# Altium footprint library PCB_GENERAL.PcbLib: 226 footprints (part 7 of 15)
Each footprint in its own frame and in the unit in brackets; x right, y up, seen from the top. Pads: shape width x height; smd on the part's side, far side on the other; paste and mask are expansions set on the pad; w line width, h text height; cw(c..) or ccw(c..) is an arc to the next point about the centre after c.
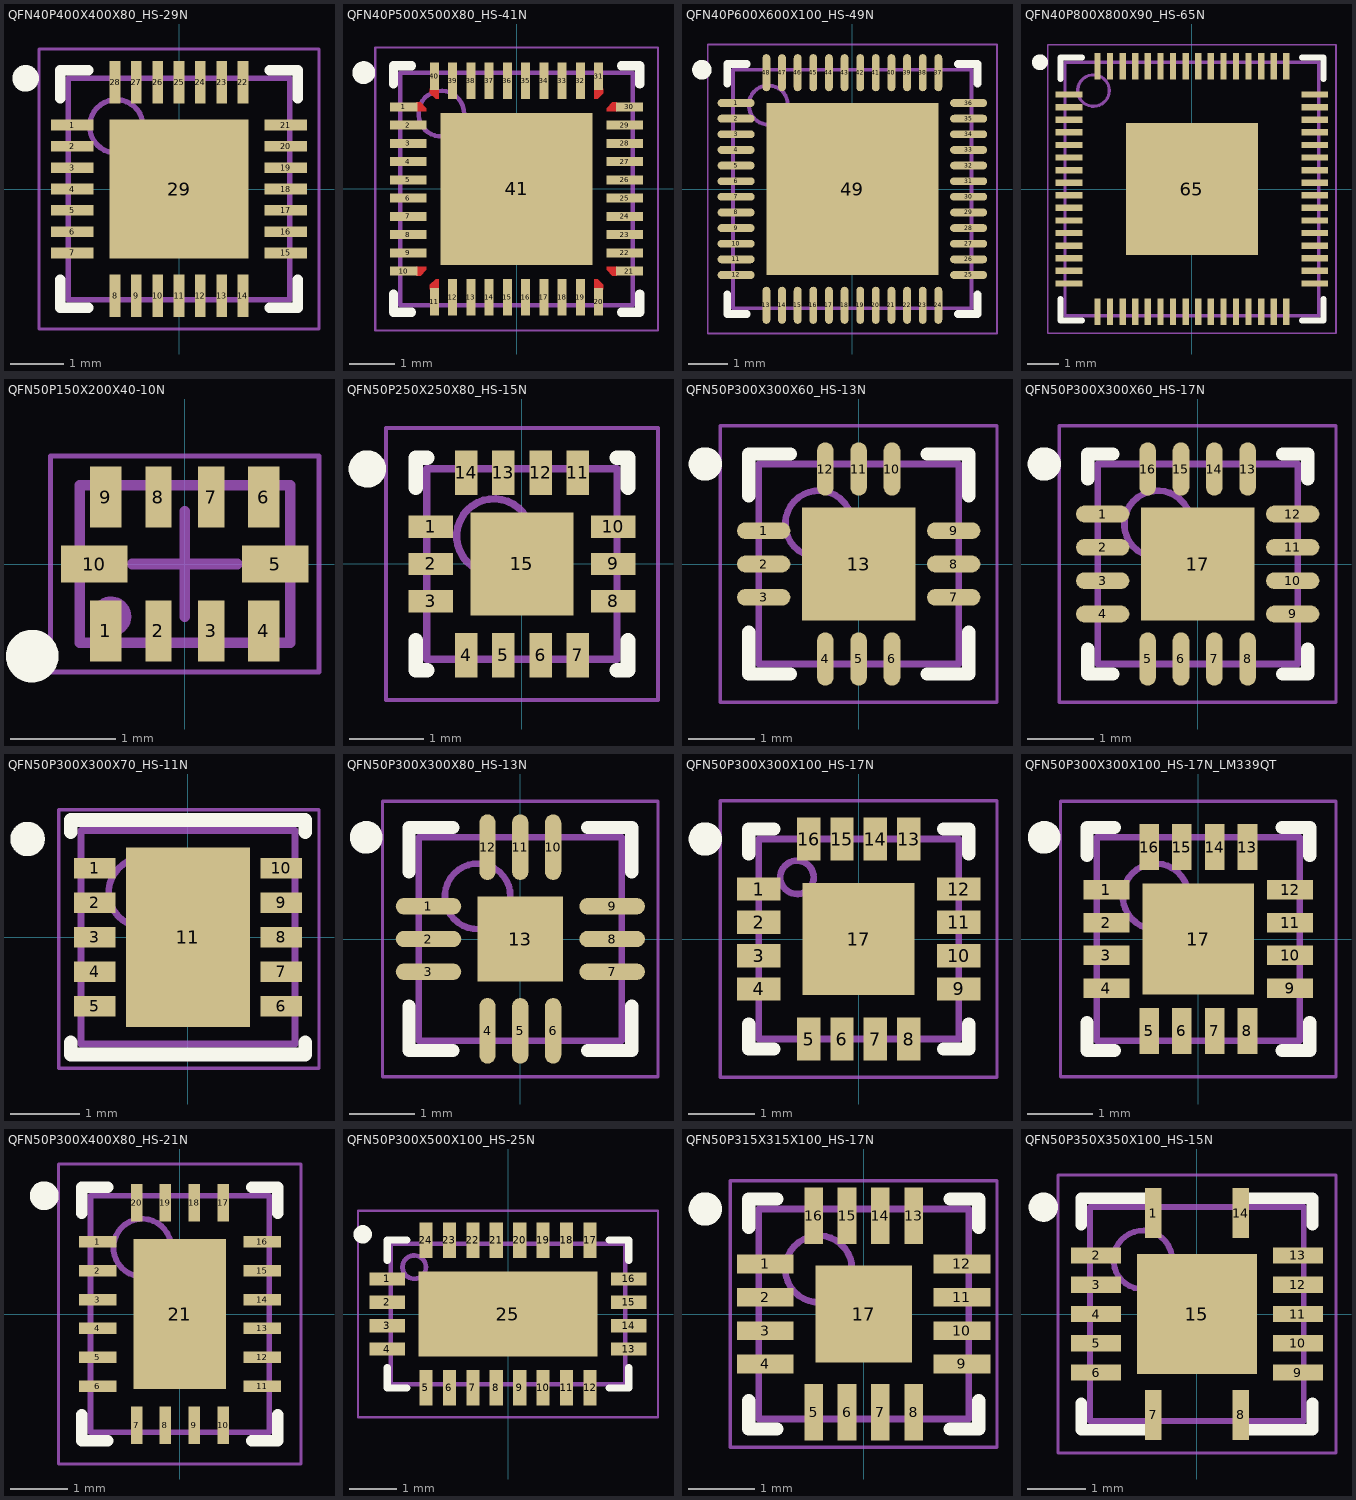
[diagram p6: the footprints below, top view; thin cyan lines are the x and y axes]

## QFN40P400X400X80_HS-29N [mm] "QFN, 28-Leads, Body 4,00x4,00mm, Pitch 0,40mm, Thermal Pad 2,60x2,60mm, IPC Medium Density"
height 0.8
pads (29):
  rect 0.8x0.2 smd: 1(-2,1.2) 2(-2,0.8) 3(-2,0.4) 4(-2,0) 5(-2,-0.4) 6(-2,-0.8) 7(-2,-1.2) 15(2,-1.2) 16(2,-0.8) 17(2,-0.4) 18(2,0) 19(2,0.4) 20(2,0.8) 21(2,1.2)
  rect 0.2x0.8 smd: 8(-1.2,-2) 9(-0.8,-2) 10(-0.4,-2) 11(0,-2) 12(0.4,-2) 13(0.8,-2) 14(1.2,-2) 22(1.2,2) 23(0.8,2) 24(0.4,2) 25(0,2) 26(-0.4,2) 27(-0.8,2) 28(-1.2,2)
  rect 2.6x2.6 smd: 29(0,0)
Top Overlay:
  circle w0.25: c-2.875,2.075 r0.125
  lines w0.2: -2.225,-1.7 -2.225,-2.225 -1.7,-2.225 ; -2.225,1.7 -2.225,2.225 -1.7,2.225 ; 1.7,-2.225 2.225,-2.225 2.225,-1.7 ; 1.7,2.225 2.225,2.225 2.225,1.7
Mechanical 11:
  text ".Designator" at -0.97,-0.25 h0.76
Mechanical 14:
  circle w0.1: c-1.175,1.175 r0.5
  lines w0.1: -2.075,-2.075 2.075,-2.075 2.075,2.075 -2.075,2.075 -2.075,-2.075
Mechanical 15:
  lines w0.05: -2.625,-2.625 2.625,-2.625 2.625,2.625 -2.625,2.625 -2.625,-2.625
  lines w0.1: -0.5,0 0.5,0 ; 0,-0.5 0,0.5
3D body "QFN40P400X400X80_HS-29N.step": height 0.8, standoff 0, extent -2.076,-2.076 2.076,2.076

## QFN40P500X500X80_HS-41N [mm] "QFN, 40-Leads, Body 5,00x5,00mm, Pitch 0,40mm, Thermal Pad 3,33x3,33mm, IPC Medium Density"
height 0.8
pads (41):
  rect 0.6x0.2 smd: 1(-2.475,1.8) 10(-2.475,-1.8) 21(2.475,-1.8) 30(2.475,1.8)
  rect 0.8x0.2 smd: 2(-2.375,1.4) 3(-2.375,1) 4(-2.375,0.6) 5(-2.375,0.2) 6(-2.375,-0.2) 7(-2.375,-0.6) 8(-2.375,-1) 9(-2.375,-1.4) 22(2.375,-1.4) 23(2.375,-1) 24(2.375,-0.6) 25(2.375,-0.2) 26(2.375,0.2) 27(2.375,0.6) 28(2.375,1) 29(2.375,1.4)
  rect 0.2x0.6 smd: 11(-1.8,-2.475) 20(1.8,-2.475) 31(1.8,2.475) 40(-1.8,2.475)
  rect 0.2x0.8 smd: 12(-1.4,-2.375) 13(-1,-2.375) 14(-0.6,-2.375) 15(-0.2,-2.375) 16(0.2,-2.375) 17(0.6,-2.375) 18(1,-2.375) 19(1.4,-2.375) 32(1.4,2.375) 33(1,2.375) 34(0.6,2.375) 35(0.2,2.375) 36(-0.2,2.375) 37(-0.6,2.375) 38(-1,2.375) 39(-1.4,2.375)
  rect 3.33x3.33 smd: 41(0,0)
Top Layer:
  region: 1.7,2.2 1.7,1.975 1.775,1.975 1.9,2.1 1.9,2.2
  region: 2.2,1.7 1.975,1.7 1.975,1.775 2.1,1.9 2.2,1.9
  region: 2.2,-1.7 1.975,-1.7 1.975,-1.775 2.1,-1.9 2.2,-1.9
  region: 1.7,-2.2 1.7,-1.975 1.775,-1.975 1.9,-2.1 1.9,-2.2
  region: -1.7,-2.2 -1.7,-1.975 -1.775,-1.975 -1.9,-2.1 -1.9,-2.2
  region: -2.2,-1.7 -1.975,-1.7 -1.975,-1.775 -2.1,-1.9 -2.2,-1.9
  region: -1.7,2.2 -1.7,1.975 -1.775,1.975 -1.9,2.1 -1.9,2.2
  region: -2.2,1.7 -1.975,1.7 -1.975,1.775 -2.1,1.9 -2.2,1.9
Top Overlay:
  circle w0.25: c-3.35,2.55 r0.125
  lines w0.2: -2.7,-2.3 -2.7,-2.7 -2.3,-2.7 ; -2.7,2.3 -2.7,2.7 -2.3,2.7 ; 2.3,-2.7 2.7,-2.7 2.7,-2.3 ; 2.3,2.7 2.7,2.7 2.7,2.3
Top Paste:
  region: 1.7,2.2 1.7,1.975 1.775,1.975 1.9,2.1 1.9,2.2
  region: 2.2,1.7 1.975,1.7 1.975,1.775 2.1,1.9 2.2,1.9
  region: 2.2,-1.7 1.975,-1.7 1.975,-1.775 2.1,-1.9 2.2,-1.9
  region: 1.7,-2.2 1.7,-1.975 1.775,-1.975 1.9,-2.1 1.9,-2.2
  region: -1.7,-2.2 -1.7,-1.975 -1.775,-1.975 -1.9,-2.1 -1.9,-2.2
  region: -2.2,-1.7 -1.975,-1.7 -1.975,-1.775 -2.1,-1.9 -2.2,-1.9
  region: -1.7,2.2 -1.7,1.975 -1.775,1.975 -1.9,2.1 -1.9,2.2
  region: -2.2,1.7 -1.975,1.7 -1.975,1.775 -2.1,1.9 -2.2,1.9
Top Solder:
  region: 1.575,1.875 1.825,1.875 2,2.05 2,2.1 1.575,2.1
  region: 1.875,1.575 1.875,1.825 2.05,2 2.1,2 2.1,1.575
  region: 1.875,-1.575 1.875,-1.825 2.05,-2 2.1,-2 2.1,-1.575
  region: 1.575,-1.875 1.825,-1.875 2,-2.05 2,-2.1 1.575,-2.1
  region: -1.575,-1.875 -1.825,-1.875 -2,-2.05 -2,-2.1 -1.575,-2.1
  region: -1.875,-1.575 -1.875,-1.825 -2.05,-2 -2.1,-2 -2.1,-1.575
  region: -1.575,1.875 -1.825,1.875 -2,2.05 -2,2.1 -1.575,2.1
  region: -1.875,1.575 -1.875,1.825 -2.05,2 -2.1,2 -2.1,1.575
Mechanical 11:
  text ".Designator" at -0.925,-0.025 h1
Mechanical 14:
  circle w0.1: c-1.65,1.65 r0.5
  lines w0.1: -2.55,-2.55 2.55,-2.55 2.55,2.55 -2.55,2.55 -2.55,-2.55
Mechanical 15:
  lines w0.05: -3.1,-3.1 3.1,-3.1 3.1,3.1 -3.1,3.1 -3.1,-3.1
  lines w0.1: -0.5,0 0.5,0 ; 0,-0.5 0,0.5
3D body "QFN40P500X500X80_HS-41N.step": height 0.8, standoff 0, extent -2.551,-2.551 2.551,2.551

## QFN40P600X600X100_HS-49N [mm] "QFN, 48-Leads, Body 6,00x6,00mm, Pitch 0,40mm, Thermal Pad 4,40x4,40mm, IPC Medium Density"
height 1
pads (49):
  oval 0.95x0.2 smd: 1(-2.975,2.2) 2(-2.975,1.8) 3(-2.975,1.4) 4(-2.975,1) 5(-2.975,0.6) 6(-2.975,0.2) 7(-2.975,-0.2) 8(-2.975,-0.6) 9(-2.975,-1) 10(-2.975,-1.4) 11(-2.975,-1.8) 12(-2.975,-2.2) 25(2.975,-2.2) 26(2.975,-1.8) 27(2.975,-1.4) 28(2.975,-1) 29(2.975,-0.6) 30(2.975,-0.2) 31(2.975,0.2) 32(2.975,0.6) 33(2.975,1) 34(2.975,1.4) 35(2.975,1.8) 36(2.975,2.2)
  oval 0.2x0.95 smd: 13(-2.2,-2.975) 14(-1.8,-2.975) 15(-1.4,-2.975) 16(-1,-2.975) 17(-0.6,-2.975) 18(-0.2,-2.975) 19(0.2,-2.975) 20(0.6,-2.975) 21(1,-2.975) 22(1.4,-2.975) 23(1.8,-2.975) 24(2.2,-2.975) 37(2.2,2.975) 38(1.8,2.975) 39(1.4,2.975) 40(1,2.975) 41(0.6,2.975) 42(0.2,2.975) 43(-0.2,2.975) 44(-0.6,2.975) 45(-1,2.975) 46(-1.4,2.975) 47(-1.8,2.975) 48(-2.2,2.975)
  rect 4.4x4.4 smd: 49(0,0)
Top Overlay:
  circle w0.25: c-3.85,3.05 r0.125
  lines w0.2: -3.2,-2.7 -3.2,-3.2 -2.7,-3.2 ; -3.2,2.7 -3.2,3.2 -2.7,3.2 ; 2.7,-3.2 3.2,-3.2 3.2,-2.7 ; 2.7,3.2 3.2,3.2 3.2,2.7
Mechanical 11:
  text ".Designator" at -2.8,-0.4 h1
Mechanical 14:
  circle w0.1: c-2.15,2.15 r0.5
  lines w0.1: -3.05,-3.05 3.05,-3.05 3.05,3.05 -3.05,3.05 -3.05,-3.05
Mechanical 15:
  lines w0.05: -3.7,-3.7 3.7,-3.7 3.7,3.7 -3.7,3.7 -3.7,-3.7
  lines w0.1: -0.5,0 0.5,0 ; 0,-0.5 0,0.5
3D body "QFN40P600X600X100_HS-49N.step": height 1, standoff 0, extent -3.051,-3.051 3.051,3.051

## QFN40P800X800X90_HS-65N [mm] "QFN, 64-Leads, Body 8.00x8.00mm, Pitch 0.40mm, Thermal Pad 4.20x4.20mm, IPC Medium Density"
height 0.9
pads (65):
  rect 0.85x0.2 smd: 1(-3.9,3) 2(-3.9,2.6) 3(-3.9,2.2) 4(-3.9,1.8) 5(-3.9,1.4) 6(-3.9,1) 7(-3.9,0.6) 8(-3.9,0.2) 9(-3.9,-0.2) 10(-3.9,-0.6) 11(-3.9,-1) 12(-3.9,-1.4) 13(-3.9,-1.8) 14(-3.9,-2.2) 15(-3.9,-2.6) 16(-3.9,-3) 33(3.9,-3) 34(3.9,-2.6) 35(3.9,-2.2) 36(3.9,-1.8) 37(3.9,-1.4) 38(3.9,-1) 39(3.9,-0.6) 40(3.9,-0.2) 41(3.9,0.2) 42(3.9,0.6) 43(3.9,1) 44(3.9,1.4) 45(3.9,1.8) 46(3.9,2.2) 47(3.9,2.6) 48(3.9,3)
  rect 0.2x0.85 smd: 17(-3,-3.9) 18(-2.6,-3.9) 19(-2.2,-3.9) 20(-1.8,-3.9) 21(-1.4,-3.9) 22(-1,-3.9) 23(-0.6,-3.9) 24(-0.2,-3.9) 25(0.2,-3.9) 26(0.6,-3.9) 27(1,-3.9) 28(1.4,-3.9) 29(1.8,-3.9) 30(2.2,-3.9) 31(2.6,-3.9) 32(3,-3.9) 49(3,3.9) 50(2.6,3.9) 51(2.2,3.9) 52(1.8,3.9) 53(1.4,3.9) 54(1,3.9) 55(0.6,3.9) 56(0.2,3.9) 57(-0.2,3.9) 58(-0.6,3.9) 59(-1,3.9) 60(-1.4,3.9) 61(-1.8,3.9) 62(-2.2,3.9) 63(-2.6,3.9) 64(-3,3.9)
  rect 4.2x4.2 smd: 65(0,0)
Top Overlay:
  circle w0.25: c-4.825,4.025 r0.125
  lines w0.2: -4.175,-3.5 -4.175,-4.175 -3.5,-4.175 ; -4.175,3.5 -4.175,4.175 -3.5,4.175 ; 3.5,-4.175 4.175,-4.175 4.175,-3.5 ; 3.5,4.175 4.175,4.175 4.175,3.5
Mechanical 11:
  text ".Designator" at -3,-0.2 h1
Mechanical 14:
  circle w0.1: c-3.125,3.125 r0.5
  lines w0.1: -4.025,-4.025 4.025,-4.025 4.025,4.025 -4.025,4.025 -4.025,-4.025
Mechanical 15:
  lines w0.05: -4.575,-4.575 4.575,-4.575 4.575,4.575 -4.575,4.575 -4.575,-4.575
  lines w0.1: -0.5,0 0.5,0 ; 0,-0.5 0,0.5
3D body: height 0.9, standoff 0, extent -4.025,-4.025 4.025,4.025

## QFN50P150X200X40-10N [mm] "QFN, 10-Leads, Body 2x1.5mm"
height 0.4
pads (10):
  rect 0.3x0.58 smd: 1(-0.75,-0.635) 4(0.75,-0.635) 6(0.75,0.635) 9(-0.75,0.635)
  rect 0.25x0.58 smd: 2(-0.25,-0.635) 3(0.25,-0.635) 7(0.25,0.635) 8(-0.25,0.635)
  rect 0.63x0.35 smd: 5(0.86,0) 10(-0.86,0)
Top Overlay:
  circle w0.25: c-1.45,-0.875 r0.125
Mechanical 11:
  text ".Designator" at -1,0 h0.3
Mechanical 14:
  circle w0.1: c-0.7,-0.5 r0.141
  lines w0.1: -1,-0.75 1,-0.75 1,0.75 -1,0.75 -1,-0.75
Mechanical 15:
  lines w0.05: -1.275,-1.025 -1.275,1.025 1.275,1.025 1.275,-1.025 -1.275,-1.025
  lines w0.1: -0.5,0 0.5,0 ; 0,-0.5 0,0.5
3D body: height 0.4, standoff 0, extent -1,-0.75 1,0.75

## QFN50P250X250X80_HS-15N [mm] "QFN, 14-Leads, Body 2,50x2,50mm, Pitch 0,50mm, Thermal Pad 1,38x1,38mm, IPC Medium Density"
height 0.8
pads (15):
  rect 0.6x0.3 smd: 1(-1.225,0.5) 2(-1.225,0) 3(-1.225,-0.5) 8(1.225,-0.5) 9(1.225,0) 10(1.225,0.5)
  rect 0.3x0.6 smd: 4(-0.75,-1.225) 5(-0.25,-1.225) 6(0.25,-1.225) 7(0.75,-1.225) 11(0.75,1.225) 12(0.25,1.225) 13(-0.25,1.225) 14(-0.75,1.225)
  rect 1.38x1.38 smd: 15(0,0)
Top Overlay:
  circle w0.25: c-2.075,1.275 r0.125
  lines w0.2: -1.425,-1.025 -1.425,-1.425 -1.275,-1.425 ; -1.425,1.025 -1.425,1.425 -1.275,1.425 ; 1.275,-1.425 1.425,-1.425 1.425,-1.025 ; 1.275,1.425 1.425,1.425 1.425,1.025
Mechanical 11:
  text ".Designator" at -0.75,-0.3 h0.76
Mechanical 14:
  circle w0.1: c-0.375,0.375 r0.5
  lines w0.1: -1.275,-1.275 -1.275,1.275 1.275,1.275 1.275,-1.275 -1.275,-1.275
Mechanical 15:
  lines w0.05: -1.825,-1.825 -1.825,1.825 1.825,1.825 1.825,-1.825 -1.825,-1.825
  lines w0.1: -0.5,0 0.5,0 ; 0,-0.5 0,0.5
3D body "QFN50P250X250X80_HS-15N.step": height 0.8, standoff 0, extent -1.276,-1.276 1.276,1.276

## QFN50P300X300X60_HS-13N [mm] "QFN, 12-Leads, Body 3,00x3,00mm, Pitch 0,50mm, Thermal Pad 1,7x1,7mm, IPC Medium Density"
height 0.6
pads (13):
  oval 0.8x0.25 smd: 1(-1.425,0.5) 2(-1.425,0) 3(-1.425,-0.5) 7(1.425,-0.5) 8(1.425,0) 9(1.425,0.5)
  oval 0.25x0.8 smd: 4(-0.5,-1.425) 5(0,-1.425) 6(0.5,-1.425) 10(0.5,1.425) 11(0,1.425) 12(-0.5,1.425)
  rect 1.7x1.7 smd: 13(0,0)
Top Overlay:
  circle w0.25: c-2.3,1.5 r0.125
  lines w0.2: -1.65,-1.025 -1.65,-1.65 -1.025,-1.65 ; -1.65,1.025 -1.65,1.65 -1.025,1.65 ; 1.025,-1.65 1.65,-1.65 1.65,-1.025 ; 1.025,1.65 1.65,1.65 1.65,1.025
Mechanical 11:
  text ".Designator" at -1.15,-0.05 h0.3
Mechanical 14:
  circle w0.1: c-0.6,0.6 r0.5
  lines w0.1: -1.5,-1.5 1.5,-1.5 1.5,1.5 -1.5,1.5 -1.5,-1.5
Mechanical 15:
  lines w0.05: -2.075,-2.075 2.075,-2.075 2.075,2.075 -2.075,2.075 -2.075,-2.075
  lines w0.1: -0.5,0 0.5,0 ; 0,-0.5 0,0.5
3D body "User Library-QFN12_3x3x0_8.STEP": height 0.78, standoff -0.02, extent -1.51,-1.51 1.51,1.51

## QFN50P300X300X60_HS-17N [mm] "QFN, 16-Leads, Body 3,00x3,00mm, Pitch 0,50mm, Thermal Pad 1,68x1,68mm, IPC Medium Density"
height 0.6
pads (17):
  oval 0.8x0.25 smd: 1(-1.425,0.75) 2(-1.425,0.25) 3(-1.425,-0.25) 4(-1.425,-0.75) 9(1.425,-0.75) 10(1.425,-0.25) 11(1.425,0.25) 12(1.425,0.75)
  oval 0.25x0.8 smd: 5(-0.75,-1.425) 6(-0.25,-1.425) 7(0.25,-1.425) 8(0.75,-1.425) 13(0.75,1.425) 14(0.25,1.425) 15(-0.25,1.425) 16(-0.75,1.425)
  rect 1.7x1.7 smd: 17(0,0)
Top Overlay:
  circle w0.25: c-2.3,1.5 r0.125
  lines w0.2: -1.65,-1.275 -1.65,-1.65 -1.275,-1.65 ; -1.65,1.275 -1.65,1.65 -1.275,1.65 ; 1.275,-1.65 1.65,-1.65 1.65,-1.275 ; 1.275,1.65 1.65,1.65 1.65,1.275
Mechanical 11:
  text ".Designator" at -1.25,-0.25 h0.3
Mechanical 14:
  circle w0.1: c-0.6,0.6 r0.5
  lines w0.1: -1.5,-1.5 -1.5,1.5 1.5,1.5 1.5,-1.5 -1.5,-1.5
Mechanical 15:
  lines w0.05: -2.075,-2.075 -2.075,2.075 2.075,2.075 2.075,-2.075 -2.075,-2.075
  lines w0.1: -0.5,0 0.5,0 ; 0,-0.5 0,0.5
3D body: height 0.6, standoff 0.05, extent -1.5,-1.5 1.5,1.5

## QFN50P300X300X70_HS-11N [mm] "QFN, 10-Leads, Body 3,00x3,00mm, Pitch 0,50mm, Thermal Pad 1,60x2,40mm, IPC Medium Density"
height 0.7
pads (11):
  rect 0.6x0.3 smd: 1(-1.35,1) 2(-1.35,0.5) 3(-1.35,0) 4(-1.35,-0.5) 5(-1.35,-1) 6(1.35,-1) 7(1.35,-0.5) 8(1.35,0) 9(1.35,0.5) 10(1.35,1)
  rect 1.8x2.6 smd: 11(0,0)
Top Overlay:
  circle w0.25: c-2.325,1.425 r0.125
  lines w0.2: -1.7,-1.525 -1.7,-1.7 0.275,-1.7 1.7,-1.7 1.7,-1.525 ; -1.7,1.525 -1.7,1.7 0.275,1.7 1.7,1.7 1.7,1.525
Mechanical 11:
  text ".Designator" at -2.25,2.65 h1
Mechanical 14:
  circle w0.1: c-0.65,0.65 r0.5
  lines w0.1: -1.55,-1.55 -1.55,1.55 1.55,1.55 1.55,-1.55 -1.55,-1.55
Mechanical 15:
  lines w0.05: -1.875,-1.9 -1.875,1.85 1.9,1.85 1.9,-1.9 -1.875,-1.9
  lines w0.1: -0.5,0 0.5,0 ; 0,-0.5 0,0.5
3D body "User Library-My-DFN-10-3x3-0_5.STEP": height 0.8, standoff 0, extent -1.56,-1.55 1.56,1.55

## QFN50P300X300X80_HS-13N [mm] "QFN, 12-Leads, Body 3,00x3,00mm, Pitch 0,50mm, Thermal Pad 1,30x1,30mm, IPC Medium Density"
height 0.8
pads (13):
  oval 1x0.25 smd: 1(-1.4,0.5) 2(-1.4,0) 3(-1.4,-0.5) 7(1.4,-0.5) 8(1.4,0) 9(1.4,0.5)
  oval 0.25x1 smd: 4(-0.5,-1.4) 5(0,-1.4) 6(0.5,-1.4) 10(0.5,1.4) 11(0,1.4) 12(-0.5,1.4)
  rect 1.3x1.3 smd: 13(0,0)
Top Overlay:
  circle w0.25: c-2.35,1.55 r0.125
  lines w0.2: -1.7,-1.025 -1.7,-1.7 -1.025,-1.7 ; -1.7,1.025 -1.7,1.7 -1.025,1.7 ; 1.025,-1.7 1.7,-1.7 1.7,-1.025 ; 1.025,1.7 1.7,1.7 1.7,1.025
Mechanical 11:
  text ".Designator" at -1.3,0.375 h1
Mechanical 14:
  circle w0.1: c-0.65,0.65 r0.5
  lines w0.1: -1.55,-1.55 1.55,-1.55 1.55,1.55 -1.55,1.55 -1.55,-1.55
Mechanical 15:
  lines w0.05: -2.1,-2.1 2.1,-2.1 2.1,2.1 -2.1,2.1 -2.1,-2.1
  lines w0.1: -0.5,0 0.5,0 ; 0,-0.5 0,0.5
3D body: height 0.8, standoff 0, extent -1.55,-1.55 1.55,1.55

## QFN50P300X300X100_HS-17N [mm] "QFN, 16-Leads, Body 3,00x3,00mm, Pitch 0,50mm, Thermal Pad 1,68x1,68mm, IPC Medium Density"
height 1
pads (17):
  rect 0.65x0.35 smd: 1(-1.5,0.75) 2(-1.5,0.25) 3(-1.5,-0.25) 4(-1.5,-0.75) 9(1.5,-0.75) 10(1.5,-0.25) 11(1.5,0.25) 12(1.5,0.75)
  rect 0.35x0.65 smd: 5(-0.75,-1.5) 6(-0.25,-1.5) 7(0.25,-1.5) 8(0.75,-1.5) 13(0.75,1.5) 14(0.25,1.5) 15(-0.25,1.5) 16(-0.75,1.5)
  rect 1.68x1.68 smd: 17(0,0)
Top Overlay:
  circle w0.25: c-2.3,1.5 r0.125
  lines w0.2: -1.65,-1.275 -1.65,-1.65 -1.275,-1.65 ; -1.65,1.275 -1.65,1.65 -1.275,1.65 ; 1.275,-1.65 1.65,-1.65 1.65,-1.275 ; 1.275,1.65 1.65,1.65 1.65,1.275
Mechanical 11:
  text ".Designator" at -1.8,2.675 h1
Mechanical 14:
  circle w0.1: c-0.925,0.925 r0.25
  lines w0.1: -1.5,-1.5 -1.5,1.5 1.5,1.5 1.5,-1.5 -1.5,-1.5
Mechanical 15:
  lines w0.05: -2.075,-2.075 -2.075,2.075 2.075,2.075 2.075,-2.075 -2.075,-2.075
  lines w0.1: -0.5,0 0.5,0 ; 0,-0.5 0,0.5
3D body "User Library-QFN-16.step": height 0.9, standoff 0, extent -1.501,-1.501 1.501,1.501

## QFN50P300X300X100_HS-17N_LM339QT [mm] "QFN, 16-Leads, Body 3,00x3,00mm, Pitch 0,50mm, Thermal Pad 1,65x1,65mm, IPC Medium Density"
height 1
pads (17):
  rect 0.7x0.3 smd: 1(-1.4,0.75) 2(-1.4,0.25) 3(-1.4,-0.25) 4(-1.4,-0.75) 9(1.4,-0.75) 10(1.4,-0.25) 11(1.4,0.25) 12(1.4,0.75)
  rect 0.3x0.7 smd: 5(-0.75,-1.4) 6(-0.25,-1.4) 7(0.25,-1.4) 8(0.75,-1.4) 13(0.75,1.4) 14(0.25,1.4) 15(-0.25,1.4) 16(-0.75,1.4)
  rect 1.7x1.7 smd: 17(0,0)
Top Overlay:
  circle w0.25: c-2.35,1.55 r0.125
  lines w0.2: -1.7,-1.275 -1.7,-1.7 -1.275,-1.7 ; -1.7,1.275 -1.7,1.7 -1.275,1.7 ; 1.275,-1.7 1.7,-1.7 1.7,-1.275 ; 1.275,1.7 1.7,1.7 1.7,1.275
Mechanical 14:
  circle w0.1: c-0.65,0.65 r0.5
  lines w0.1: -1.55,-1.55 -1.55,1.55 1.55,1.55 1.55,-1.55 -1.55,-1.55
Mechanical 15:
  lines w0.05: -2.1,-2.1 -2.1,2.1 2.1,2.1 2.1,-2.1 -2.1,-2.1
  lines w0.1: -0.5,0 0.5,0 ; 0,-0.5 0,0.5
3D body "QFN50P300X300X100_HS-17N_zujs.step": height 1, standoff 0, extent -1.6,-1.6 1.6,1.6

## QFN50P300X400X80_HS-21N [mm] "QFN, 20-Leads, Body 3,00x4,00mm, Pitch 0,50mm, Thermal Pad 1,60x2,60mm, IPC Medium Density"
height 0.8
pads (21):
  rect 0.65x0.2 smd: 1(-1.425,1.25) 2(-1.425,0.75) 3(-1.425,0.25) 4(-1.425,-0.25) 5(-1.425,-0.75) 6(-1.425,-1.25) 11(1.425,-1.25) 12(1.425,-0.75) 13(1.425,-0.25) 14(1.425,0.25) 15(1.425,0.75) 16(1.425,1.25)
  rect 0.2x0.65 smd: 7(-0.75,-1.925) 8(-0.25,-1.925) 9(0.25,-1.925) 10(0.75,-1.925) 17(0.75,1.925) 18(0.25,1.925) 19(-0.25,1.925) 20(-0.75,1.925)
  rect 1.6x2.6 smd: 21(0,0)
Top Overlay:
  circle w0.25: c-2.35,2.05 r0.125
  lines w0.2: -1.7,-1.75 -1.7,-2.2 -1.25,-2.2 ; -1.7,1.75 -1.7,2.2 -1.25,2.2 ; 1.25,-2.2 1.7,-2.2 1.7,-1.75 ; 1.25,2.2 1.7,2.2 1.7,1.75
Mechanical 11:
  text ".Designator" at -1.1,-0.15 h1
Mechanical 14:
  circle w0.1: c-0.65,1.15 r0.5
  lines w0.1: -1.55,-2.05 -1.55,2.05 1.55,2.05 1.55,-2.05 -1.55,-2.05
Mechanical 15:
  lines w0.05: -2.1,-2.6 -2.1,2.6 2.1,2.6 2.1,-2.6 -2.1,-2.6
  lines w0.1: -0.5,0 0.5,0 ; 0,-0.5 0,0.5
3D body "QFN50P300X400X80_HS-21N.step": height 0.8, standoff 0, extent -1.551,-2.051 1.551,2.051

## QFN50P300X500X100_HS-25N [mil] "QFN24_3X5_0P5_EPAD"
height 39.37
pads (25):
  rect 30.01x11 smd: 1(-101.51,29.51) 2(-101.51,9.84) 3(-101.51,-9.85) 4(-101.51,-29.53) 13(101.5,-29.53) 14(101.49,-9.85) 15(101.49,9.84) 16(101.5,29.51)
  rect 11x30.01 smd: 5(-68.89,-62.01) 6(-49.21,-62.01) 7(-29.52,-62.01) 8(-9.85,-62.01) 9(9.84,-62.01) 10(29.51,-62.01) 11(49.19,-62.01) 12(68.87,-62.01) 17(68.87,62) 18(49.19,61.99) 19(29.51,61.99) 20(9.84,61.99) 21(-9.85,61.99) 22(-29.52,61.99) 23(-49.21,61.99) 24(-68.89,62)
  rect 150.01x71.01 smd: 25(-0.01,-0.01)
Top Overlay:
  circle w12: c-122.05,66.93 r1.65
  lines w6: -101.44,-45 -101.44,-62.06 -85.01,-62.06 ; -101.44,45 -101.44,62.06 -85.01,62.06 ; 84.99,-62.06 101.41,-62.06 101.41,-45 ; 84.99,62.06 101.41,62.06 101.41,45
Top Paste:
  pour cut-out: -39.34,3.94 -66.9,3.94 -66.9,27.54 -39.34,27.53
  pour cut-out: -39.34,-27.56 -66.9,-27.56 -66.9,-3.95 -39.34,-3.95
  pour cut-out: 66.89,-27.56 39.32,-27.56 39.32,-3.95 66.89,-3.95
  pour cut-out: 66.88,3.95 39.32,3.95 39.32,27.54 66.88,27.55
  pour cut-out: -3.94,-27.56 -31.5,-27.56 -31.5,-3.95 -3.94,-3.95
  pour cut-out: 31.48,-27.55 3.92,-27.56 3.92,-3.95 31.48,-3.96
  pour cut-out: 31.48,3.95 3.92,3.95 3.92,27.55 31.48,27.55
  pour cut-out: -3.95,3.95 -31.49,3.95 -31.5,27.54 -3.94,27.54
Mechanical 11:
  text ".Designator" at -62.99,17.72 h39.37
Mechanical 14:
  circle w3.94: c-78.74,39.37 r9.84
  lines w3.94: -98.43,-59.06 -98.43,59.06 98.43,59.06 98.43,-59.06 -98.43,-59.06
Mechanical 15:
  lines w1.97: -125.98,-86.61 125.98,-86.61 125.98,86.61 -125.98,86.61 -125.98,27.56 -125.98,-86.61
3D body "QQQQQmizu.step": height 39.37, standoff 0, extent -100.79,-61.42 100.79,61.42

## QFN50P315X315X100_HS-17N [mm] "QFN, 16-Leads, Body 3x3mm, Pitch 0.5mm, Thermal Pad 1.45x1.45mm, TI Recommended"
height 1
pads (17):
  rect 0.85x0.28 smd paste-0.025 mask+0.07: 1(-1.475,0.75) 2(-1.475,0.25) 3(-1.475,-0.25) 4(-1.475,-0.75) 9(1.475,-0.75) 10(1.475,-0.25) 11(1.475,0.25) 12(1.475,0.75)
  rect 0.28x0.85 smd paste-0.025 mask+0.07: 5(-0.75,-1.475) 6(-0.25,-1.475) 7(0.25,-1.475) 8(0.75,-1.475) 13(0.75,1.475) 14(0.25,1.475) 15(-0.25,1.475) 16(-0.75,1.475)
  rect 1.45x1.45 smd paste-0.725 mask+0.07: 17(0,0)
Top Overlay:
  circle w0.25: c-2.375,1.575 r0.125
  lines w0.2: -1.725,-1.3 -1.725,-1.725 -1.3,-1.725 ; -1.725,1.3 -1.725,1.725 -1.3,1.725 ; 1.3,-1.725 1.725,-1.725 1.725,-1.3 ; 1.3,1.725 1.725,1.725 1.725,1.3
Top Paste:
  rectangle: -0.6,-0.6 0.6,0.6
Mechanical 11:
  text ".Designator" at -2.15,2.375 h1
Mechanical 14:
  circle w0.1: c-0.675,0.675 r0.5
  lines w0.1: -1.575,-1.575 1.575,-1.575 1.575,1.575 -1.575,1.575 -1.575,-1.575
Mechanical 15:
  lines w0.05: -2,-2 2,-2 2,2 -2,2 -2,-2
  lines w0.1: -0.5,0 0.5,0 ; 0,-0.5 0,0.5
3D body: height 1, standoff 0, extent -1.575,-1.575 1.575,1.575

## QFN50P350X350X100_HS-15N [mm] "QFN, 14-Leads, Body 3,50x3,50mm, Pitch 0,50mm, Thermal Pad 2,05x2,05mm, IPC Medium Density"
height 1
pads (15):
  rect 0.28x0.85 smd: 1(-0.75,1.725) 7(-0.75,-1.725) 8(0.75,-1.725) 14(0.75,1.725)
  rect 0.85x0.28 smd: 2(-1.725,1) 3(-1.725,0.5) 4(-1.725,0) 5(-1.725,-0.5) 6(-1.725,-1) 9(1.725,-1) 10(1.725,-0.5) 11(1.725,0) 12(1.725,0.5) 13(1.725,1)
  rect 2.05x2.05 smd: 15(0,0)
Top Overlay:
  circle w0.25: c-2.625,1.825 r0.125
  lines w0.2: -1.975,-1.525 -1.975,-1.975 -0.775,-1.975 ; -1.975,1.525 -1.975,1.975 -0.775,1.975 ; 0.775,-1.975 1.975,-1.975 1.975,-1.525 ; 0.775,1.975 1.975,1.975 1.975,1.525
Mechanical 11:
  text ".Designator" at -1.225,-0.225 h1
Mechanical 14:
  circle w0.1: c-0.925,0.925 r0.5
  lines w0.1: -1.825,-1.825 -1.825,1.825 1.825,1.825 1.825,-1.825 -1.825,-1.825
Mechanical 15:
  lines w0.05: -2.375,-2.375 -2.375,2.375 2.375,2.375 2.375,-2.375 -2.375,-2.375
  lines w0.1: -0.5,0 0.5,0 ; 0,-0.5 0,0.5
3D body "QFN50P350X350X100_HS-15N.step": height 1, standoff 0, extent -1.826,-1.826 1.826,1.826